# Altium footprint library PcbLib.PcbLib: 65 footprints (part 2 of 5)
Each footprint in its own frame and in the unit in brackets; x right, y up, seen from the top. Pads: shape width x height; smd on the part's side, far side on the other; paste and mask are expansions set on the pad; w line width, h text height; cw(c..) or ccw(c..) is an arc to the next point about the centre after c.
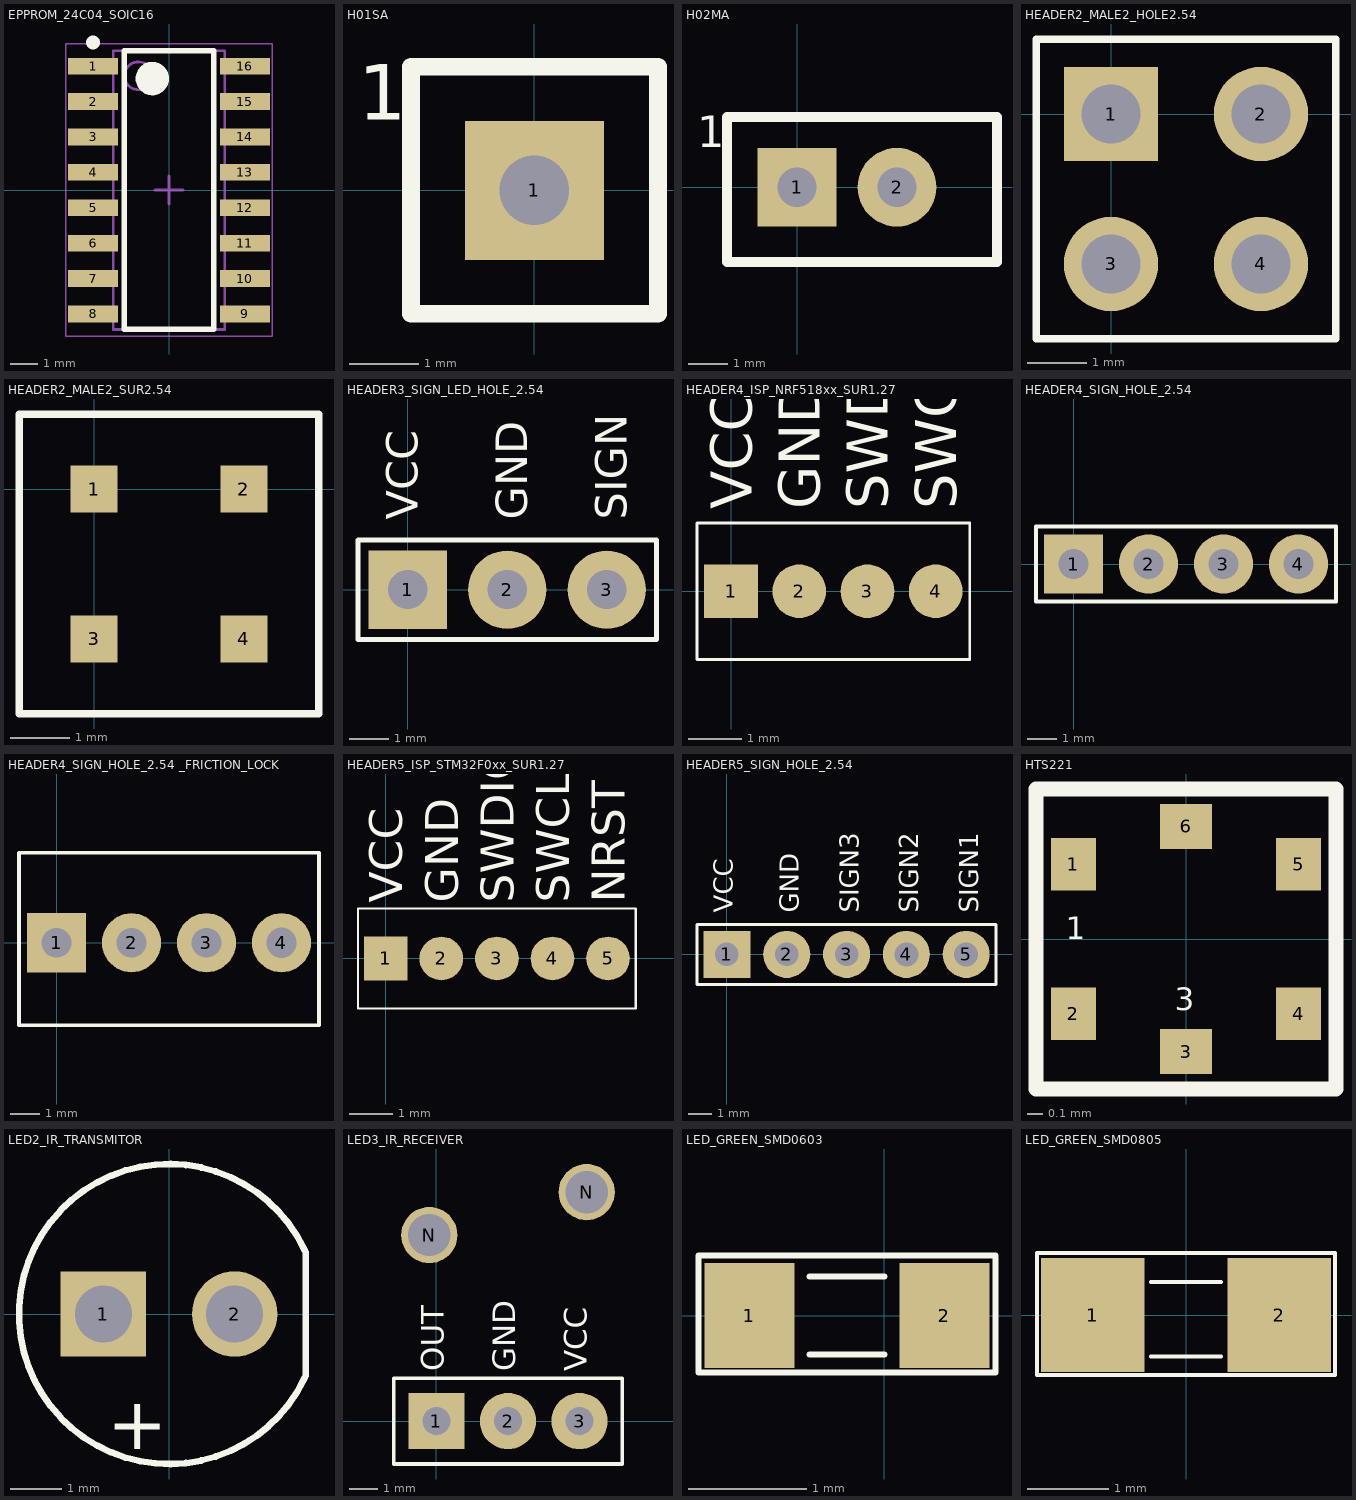
[diagram p1: the footprints below, top view; thin cyan lines are the x and y axes]

## EPPROM_24C04_SOIC16 [mm] "EPPROM24 SURFACE SOIC16"
height 1.75
pads (16):
  rect 1.8x0.6 smd: 1(-2.725,4.445) 2(-2.725,3.175) 3(-2.725,1.905) 4(-2.725,0.635) 5(-2.725,-0.635) 6(-2.725,-1.905) 7(-2.725,-3.175) 8(-2.725,-4.445) 9(2.725,-4.445) 10(2.725,-3.175) 11(2.725,-1.905) 12(2.725,-0.635) 13(2.725,0.635) 14(2.725,1.905) 15(2.725,3.175) 16(2.725,4.445)
Top Overlay:
  circle w0.6: c-0.6,4 r0.3
  circle w0.25: c-2.725,5.295 r0.125
  lines w0.2: -1.6,-5 1.6,-5 1.6,5 -1.6,5 -1.6,-5
Mechanical 13:
  circle w0.1: c-1.1,4.1 r0.5
  lines w0.1: -2,-5 2,-5 2,5 -2,5 -2,-5
Mechanical 15:
  lines w0.05: -3.7,-5.25 3.7,-5.25 3.7,5.25 -3.7,5.25 -3.7,-5.25
  lines w0.1: -0.5,0 0.5,0 ; 0,-0.5 0,0.5
3D body: height 1.75, standoff 0.2, extent -2,-5 2,5

## H01SA [mm] "HEADER, SINGLE, DISTANCE = 100mil"
pads (1):
  rect 2x2 hole 1: 1(0,0)
Top Overlay:
  lines w0.254: -1.778,-1.778 -1.778,1.778 1.778,1.778 1.778,-1.778 -1.778,-1.778
  text "1" at -2.54,1.016 h0.8

## H02MA [mm] "HEADER, SINGLE, DISTANCE = 100mil"
pads (2):
  rect 2x2 hole 1: 1(0,0)
  round 2 hole 1: 2(2.54,0)
Top Overlay:
  lines w0.254: -1.778,-1.905 -1.778,1.778 5.08,1.778 5.08,-1.905 -1.778,-1.905
  text "1" at -2.54,1.016 h0.8

## HEADER2_MALE2_HOLE2.54 [mm] "HEADER, SINGLE, DISTANCE = 100mil"
pads (4):
  rect 1.6x1.6 hole 1: 1(0,0)
  round 1.6 hole 1: 2(2.54,0) 3(0,-2.54) 4(2.54,-2.54)
Top Overlay:
  lines w0.127: -1.27,-3.81 3.81,-3.81 3.81,1.27 -1.27,1.27 -1.27,-3.81
3D body "User Library-Header1x2.STEP": height 8.17, standoff -2.81, extent -1.27,-3.81 3.81,-1.27
3D body "User Library-Header1x2.STEP": height 8.17, standoff -2.81, extent -1.27,-1.27 3.81,1.27

## HEADER2_MALE2_SUR2.54 [mm] "HEADER, SINGLE, DISTANCE = 100mil"
pads (4):
  rect 0.8x0.8 smd: 1(0,0) 2(2.54,0) 3(0,-2.54) 4(2.54,-2.54)
Top Overlay:
  lines w0.127: -1.27,-3.81 3.81,-3.81 3.81,1.27 -1.27,1.27 -1.27,-3.81
3D body "User Library-Header1x2.STEP": height 8.17, standoff -2.81, extent -1.27,-3.81 3.81,-1.27
3D body "User Library-Header1x2.STEP": height 8.17, standoff -2.81, extent -1.27,-1.27 3.81,1.27

## HEADER3_SIGN_LED_HOLE_2.54 [mm] "HEADER, SINGLE, DISTANCE = 100mil"
pads (3):
  rect 2x2 hole 1: 1(0,0)
  round 2 hole 1: 2(2.54,0) 3(5.08,0)
Top Overlay:
  lines w0.127: -1.27,-1.27 6.35,-1.27 6.35,1.27 -1.27,1.27 -1.27,-1.27
  text "VCC" at 0.254,1.778 h0.8
  text "GND" at 3.048,1.778 h0.8
  text "SIGN" at 5.588,1.778 h0.8
3D body "User Library-Header_Male_3Pin.STEP": height 8.54, standoff -3, extent -1.27,-1.27 6.35,1.22

## HEADER4_ISP_NRF518xx_SUR1.27 [mm] "HEADER, SINGLE, DISTANCE = 100mil"
pads (4):
  rect 1x1 smd: 1(0,0)
  round 1 smd: 2(1.27,0) 3(2.54,0) 4(3.81,0)
Top Overlay:
  lines w0.051: -0.635,-1.27 -0.635,1.27 4.445,1.27 4.445,-1.27 -0.635,-1.27
  text "VCC" at 0.381,1.524 h0.76
  text "GND" at 1.651,1.524 h0.76
  text "SWDIO" at 2.921,1.524 h0.76
  text "SWCLK" at 4.191,1.524 h0.76
3D body "User Library-PinHeader1_27_2.STEP": height 5, standoff -2.3, extent -0.635,-1.19 1.905,1.21
3D body "User Library-PinHeader1_27_2.STEP": height 5, standoff -2.3, extent 1.905,-1.2 4.445,1.2

## HEADER4_SIGN_HOLE_2.54 [mm] "HEADER, SINGLE, DISTANCE = 100mil"
height 7.5
pads (4):
  rect 2x2 hole 1: 1(0,0)
  round 2 hole 1: 2(2.54,0) 3(5.08,0)
  round 2 hole 1.02: 4(7.62,0)
Top Overlay:
  lines w0.127: -1.27,-1.27 -1.27,1.27 8.89,1.27 8.89,-1.27 -1.27,-1.27
3D body "User Library-Header_Male_4Pin.STEP": height 8.54, standoff -3, extent -1.27,-1.245 8.89,1.245

## HEADER4_SIGN_HOLE_2.54 _FRICTION_LOCK [mm] "HEADER, SINGLE, DISTANCE = 100mil"
height 7.5
pads (4):
  rect 2x2 hole 1: 1(0,0)
  round 2 hole 1: 2(2.54,0) 3(5.08,0)
  round 2 hole 1.02: 4(7.62,0)
Top Overlay:
  lines w0.127: -1.27,-2.794 8.89,-2.794 8.89,3.048 -1.27,3.048 -1.27,-2.794
3D body "12156.stp": height 10.03, standoff -3.56, extent -1.27,-2.794 8.89,3.048

## HEADER5_ISP_STM32F0xx_SUR1.27 [mm] "HEADER, SINGLE, DISTANCE = 100mil"
pads (5):
  rect 1x1 smd: 1(0,0)
  round 1 smd: 2(1.27,0) 3(2.54,0) 4(3.81,0) 5(5.08,0)
Top Overlay:
  lines w0.051: -0.635,-1.143 5.715,-1.143 5.715,1.143 -0.635,1.143 -0.635,-1.143
  text "NRST" at 5.461,1.27 h0.76
  text "SWCLK" at 4.191,1.27 h0.76
  text "SWDIO" at 2.921,1.27 h0.76
  text "GND" at 1.651,1.27 h0.76
  text "VCC" at 0.381,1.27 h0.76
3D body "User Library-PinHeader1_27_3.STEP": height 5, standoff -2.3, extent 1.905,-1.2 5.715,1.2
3D body "User Library-PinHeader1_27_2.STEP": height 5, standoff -2.3, extent -0.635,-1.2 1.905,1.2

## HEADER5_SIGN_HOLE_2.54 [mm] "HEADER, SINGLE, DISTANCE = 100mil"
pads (5):
  rect 2x2 hole 1: 1(0,0)
  round 2 hole 1: 2(2.54,0) 3(5.08,0)
  round 2 hole 1.02: 4(7.62,0) 5(10.16,0)
Top Overlay:
  lines w0.127: -1.27,-1.27 11.43,-1.27 11.43,1.27 -1.27,1.27 -1.27,-1.27
  text "VCC" at 0.254,1.778 h0.8
  text "GND" at 3.048,1.778 h0.8
  text "SIGN3" at 5.588,1.778 h0.8
  text "SIGN2" at 8.128,1.778 h0.8
  text "SIGN1" at 10.668,1.778 h0.8
3D body "User Library-Header_Male_5Pin.STEP": height 8.54, standoff -3, extent -1.27,-1.27 11.43,1.22

## HTS221 [mm]
pads (6):
  rect 0.3x0.35 smd mask+0.05: 1(-0.75,0.5) 2(-0.75,-0.5) 4(0.75,-0.5) 5(0.75,0.5)
  rect 0.35x0.3 smd mask+0.05: 3(0,-0.75) 6(0,0.75)
Top Overlay:
  lines w0.1: -1,-1 1,-1 1,1 -1,1 -1,-1
  text "1" at -0.8,0 h0.15
  text "3" at -0.075,-0.475 h0.15

## LED2_IR_TRANSMITOR [mil] "LED phi 5mm"
height 649.61
pads (2):
  rect 65x65 hole 43.31: 1(-50,0)
  round 65 hole 43.31: 2(50,0)
Top Overlay:
  lines w5: 103.49,-48.23 cw(c0,0) 103.49,48.23 ; 104,-47 104,46.9
  text "+" at -47,-103 h40
3D body "User Library-LED5MM.step": height 496.06, standoff -118.11, extent -116.14,-118.13 116.14,114.15

## LED3_IR_RECEIVER [mm] "HEADER, SINGLE, DISTANCE = 100mil"
pads (5):
  rect 2x2 hole 1: 1(0,0)
  round 2 hole 1: 2(2.54,0) 3(5.08,0)
  round 2 hole 1.5: N(-0.254,6.604) N(5.334,8.128)
Top Overlay:
  lines w0.127: -1.524,-1.524 6.604,-1.524 6.604,1.524 -1.524,1.524 -1.524,-1.524
  text "OUT" at 0.254,1.778 h0.8
  text "GND" at 2.794,1.778 h0.8
  text "VCC" at 5.334,1.778 h0.8
3D body "User Library-GP1UE26.step": height 7.1, standoff -3.6, extent -0.704,-0.328 6.096,9.472

## LED_GREEN_SMD0603 [mil] "Compoment SMD 60x30mil"
height 50
pads (2):
  rect 30x35 smd: 1(-45,0) 2(20,0)
Top Overlay:
  lines w2: -25,-13 0,-13 ; -25,13 0,13 ; -62,-19 -52.75,-19 -0.25,-19 37,-19 37,20 -62,20 -62,-19
3D body "User Library-LED_0603_G.STEP": height 23.62, standoff -0.08, extent -46.49,-15.74 16.51,15.75

## LED_GREEN_SMD0805 [mil] "Compoment SMD 80x50mil"
height 50
pads (2):
  rect 50x55 smd: 1(-45,0) 2(45,0)
Top Overlay:
  lines w2: -17,-20 17,-20 ; -17,16 17,16 ; -72,-29 72,-29 72,30 -72,30 -72,-29
3D body "SML-210PTT86.stp": height 31.5, standoff 0, extent -39.36,-24.6 39.38,24.61